# Altium footprint library General.PcbLib: 128 footprints (part 8 of 8)
Each footprint in its own frame and in the unit in brackets; x right, y up, seen from the top. Pads: shape width x height; smd on the part's side, far side on the other; paste and mask are expansions set on the pad; w line width, h text height; cw(c..) or ccw(c..) is an arc to the next point about the centre after c.
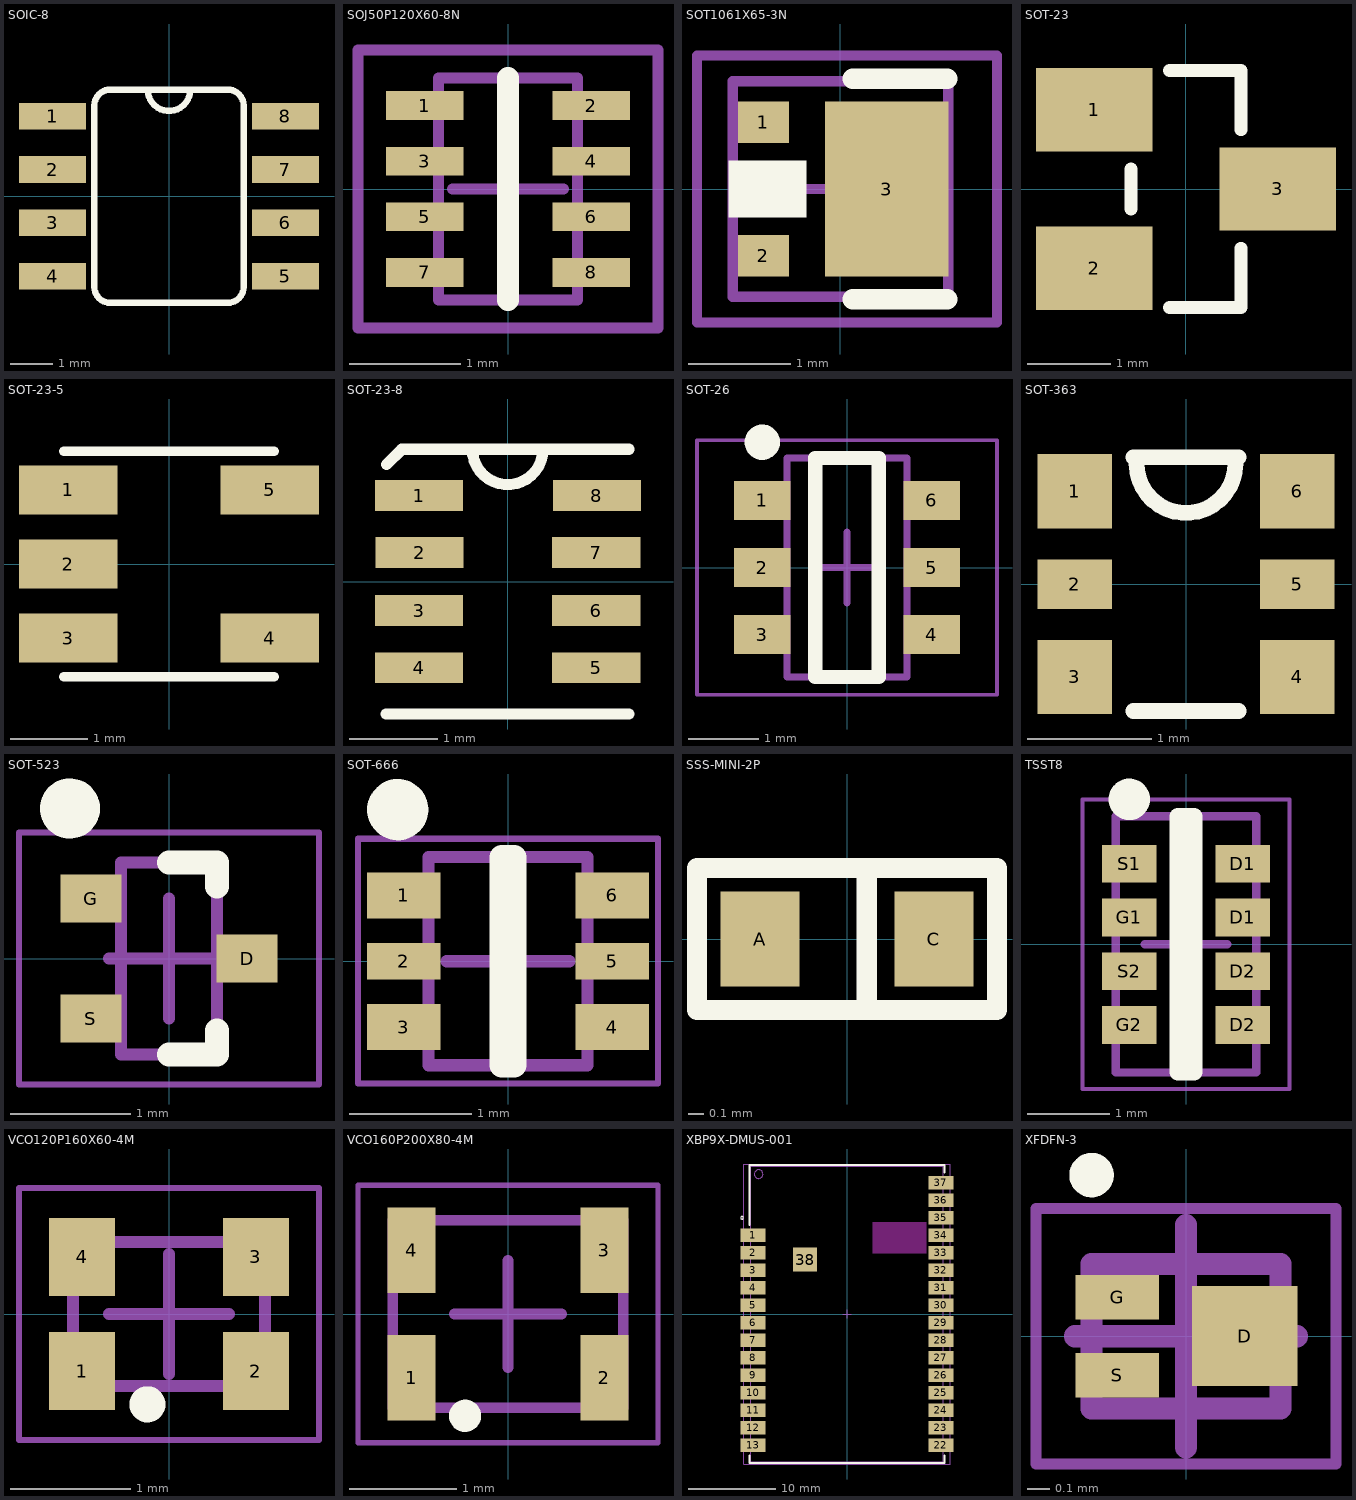
[diagram p7: the footprints below, top view; thin cyan lines are the x and y axes]

## SOIC-8 [mm]
pads (8):
  rect 1.6x0.635 smd: 1(-2.773,1.905) 2(-2.773,0.635) 3(-2.773,-0.635) 4(-2.773,-1.905) 5(2.773,-1.905) 6(2.773,-0.635) 7(2.773,0.635) 8(2.773,1.905)
Top Overlay:
  lines w0.152: -1.422,-2.54 1.422,-2.54 ; -1.422,2.54 1.422,2.54 ; -1.397,-2.54 cw(c-1.397,-2.159) -1.778,-2.159 -1.778,2.159 cw(c-1.397,2.159) -1.397,2.54 ; -0.508,2.54 ccw(c0,2.54) 0.508,2.54 ; 1.397,-2.54 ccw(c1.397,-2.159) 1.778,-2.159 1.778,2.159 ccw(c1.397,2.159) 1.397,2.54
3D body "SW3dPS-Maxim_SOIC8.step": height 1.87, standoff 0.02, extent -3.1,-2.5 3.1,2.5

## SOJ50P120X60-8N [mm] "SOJ, 8-Leads, Body 2.0x1.3mm (max), Pitch 0.50mm, IPC Medium Density"
height 0.6
pads (8):
  rect 0.7x0.26 smd: 1(-0.75,0.75) 2(0.75,0.75) 3(-0.75,0.25) 4(0.75,0.25) 5(-0.75,-0.25) 6(0.75,-0.25) 7(-0.75,-0.75) 8(0.75,-0.75)
Top Overlay:
  lines w0.2: 0,-1 0,1 0,-1
Mechanical 13:
  lines w0.1: -0.625,-1 -0.625,1 0.625,1 0.625,-1 -0.625,-1
Mechanical 15:
  lines w0.1: -0.5,0 0.5,0 ; 0,-0.5 0,0.5 ; -1.35,-1.25 -1.35,1.25 1.35,1.25 1.35,-1.25 -1.35,-1.25
3D body: height 0.6, standoff 0.01, extent -0.625,-1 0.625,1

## SOT1061X65-3N [mm] "SOT1061, 3-Leads, Body 2.1x2.3mm (max), Pitch 0.65mm, IPC Medium Density"
height 0.65
pads (3):
  rect 0.5x0.4 smd: 1(-0.75,0.65) 2(-0.75,-0.65)
  rect 1.2x1.7 smd: 3(0.45,0)
Top Overlay:
  rectangle: -1.092,-0.279 -0.33,0.279
  lines w0.2: 0.121,-1.075 1.041,-1.075 ; 0.121,1.075 1.041,1.075
Mechanical 13:
  lines w0.1: -1.05,-1.05 1.05,-1.05 1.05,1.05 -1.05,1.05 -1.05,-1.05
Mechanical 15:
  lines w0.1: -0.5,0 0.5,0 ; 0,-0.5 0,0.5 ; -1.397,-1.3 1.524,-1.3 1.524,1.3 -1.397,1.3 -1.397,-1.3
3D body: height 0.65, standoff 0, extent -1.05,-1.05 1.05,1.05

## SOT-23 [mm]
pads (3):
  rect 1.4x1 smd: 1(-1.1,0.95) 2(-1.1,-0.95) 3(1.1,0)
Top Overlay:
  lines w0.152: -0.66,-0.24 -0.66,0.24 ; -0.198,-1.422 0.66,-1.422 0.66,-0.711 ; -0.198,1.422 0.66,1.422 0.66,0.711
3D body "SW3dPS-SOT-23.step": height 0.98, standoff -0.02, extent -1.21,-1.448 1.21,1.448

## SOT-23-5 [mm]
pads (5):
  rect 1.27x0.635 smd: 1(-1.295,0.953) 2(-1.295,0) 3(-1.295,-0.953) 4(1.295,-0.953) 5(1.295,0.953)
Top Overlay:
  lines w0.127: -1.35,-1.45 1.35,-1.45 ; -1.35,1.45 1.35,1.45
3D body "SW3dPS-SOT23-5.STEP": height 1.12, standoff 0.02, extent -1.395,-1.447 1.405,1.453

## SOT-23-8 [mm]
pads (8):
  rect 1x0.35 smd: 1(-1.004,0.976) 2(-0.999,0.329) 3(-1.004,-0.329) 4(-1.004,-0.976) 5(1.004,-0.976) 6(1.004,-0.329) 7(1.004,0.329) 8(1.012,0.976)
Top Overlay:
  lines w0.127: -1.375,-1.5 1.375,-1.5 ; -1.372,1.328 -1.2,1.5 -0.4,1.5 ; 1.375,1.5 0.4,1.5 ; -0.4,1.5 ccw(c0,1.5) 0.4,1.5 ; -0.4,1.5 0.4,1.5
3D body "User Library-SOT23-8.step": height 1.11, standoff 0, extent -1.4,-1.5 1.403,1.5

## SOT-26 [mm] "SOT26, 6-Leads, Body 3.00x2.85mm, Pitch 0.95mm, IPC Medium Density"
height 1.4
pads (6):
  rect 0.8x0.55 smd: 1(-1.2,0.95) 2(-1.2,0) 3(-1.2,-0.95) 4(1.2,-0.95) 5(1.2,0) 6(1.2,0.95)
Top Overlay:
  circle w0.25: c-1.2,1.775 r0.125
  lines w0.2: -0.45,-1.55 -0.45,1.55 0.45,1.55 0.45,-1.55 -0.45,-1.55
Mechanical 13:
  lines w0.1: -0.85,-1.55 0.85,-1.55 0.85,1.55 -0.85,1.55 -0.85,-1.55
Mechanical 15:
  lines w0.05: -2.125,-1.8 2.125,-1.8 2.125,1.8 -2.125,1.8 -2.125,-1.8
  lines w0.1: -0.5,0 0.5,0 ; 0,-0.5 0,0.5
3D body "SOT26.step": height 1.4, standoff 0, extent -1.5,-1.55 1.5,1.55

## SOT-363 [mm]
pads (6):
  rect 0.6x0.6 smd: 1(-0.9,0.75) 3(-0.9,-0.75) 4(0.9,-0.75) 6(0.9,0.75)
  rect 0.6x0.4 smd: 2(-0.9,0) 5(0.9,0)
Top Overlay:
  lines w0.127: -0.425,-1.025 0.425,-1.025 ; -0.425,1.025 0.425,1.025 ; -0.4,0.975 ccw(c0,0.975) 0.4,0.975
3D body "User Library-SW3dPS-SOT363.step": height 1.01, standoff 0.02, extent -1.05,-1 1.05,1

## SOT-523 [mm] "SOT523, 3-Leads, Body 1.55x1.60mm, Pitch 0.50mm, IPC Medium Density"
height 0.8
pads (3):
  rect 0.51x0.4 smd: D(0.65,0) G(-0.65,0.5) S(-0.65,-0.5)
Top Overlay:
  circle w0.25: c-0.825,1.25 r0.125
  lines w0.2: 0,-0.8 0.4,-0.8 0.4,-0.6 ; 0,0.8 0.4,0.8 0.4,0.6
Mechanical 13:
  lines w0.1: -0.4,-0.8 0.4,-0.8 0.4,0.8 -0.4,0.8 -0.4,-0.8
Mechanical 15:
  lines w0.05: -1.25,-1.05 1.25,-1.05 1.25,1.05 -1.25,1.05 -1.25,-1.05
  lines w0.1: -0.5,0 0.5,0 ; 0,-0.5 0,0.5
3D body "SOT50P160X80-3N.step": height 0.8, standoff 0, extent -0.875,-0.8 0.875,0.8

## SOT-666 [mm] "SOTFL, 6-Leads, Body 1.60x1.60mm, Pitch 0.50mm, IPC Medium Density"
height 0.6
pads (6):
  rect 0.6x0.375 smd: 1(-0.85,0.537) 3(-0.85,-0.537) 4(0.85,-0.537) 6(0.85,0.537)
  rect 0.6x0.3 smd: 2(-0.85,0) 5(0.85,0)
Top Overlay:
  circle w0.25: c-0.9,1.237 r0.125
  lines w0.2: -0.05,-0.85 0.05,-0.85 0.05,0.85 -0.05,0.85 -0.05,-0.85
Mechanical 13:
  lines w0.1: -0.65,-0.85 -0.65,0.85 0.65,0.85 0.65,-0.85 -0.65,-0.85
Mechanical 15:
  lines w0.05: -1.225,-1 -1.225,1 1.225,1 1.225,-1 -1.225,-1
  lines w0.1: -0.5,0 0.5,0 ; 0,-0.5 0,0.5
3D body "User Library-SOT50P160X60-6.STEP": height 0.6, standoff 0, extent -0.8,-0.796 0.8,0.795

## SSS-MINI-2P [mm]
pads (2):
  rect 0.5x0.6 smd: A(-0.55,0) C(0.55,0)
Top Overlay:
  lines w0.127: 0.125,-0.4 0.125,0.4 ; -0.95,-0.45 0.95,-0.45 0.95,0.45 -0.95,0.45 -0.95,-0.45
3D body: height 0.56, standoff 0, extent 0.301,-0.299 0.499,0.299
3D body: height 0.55, standoff 0, extent -0.5,-0.3 0.5,0.3

## TSST8 [mm] "TSST, 8-Leads, Body 3.03x1.63mm, Pitch 0.65mm, IPC Medium Density"
height 1.1
pads (8):
  rect 0.66x0.457 smd: D1(0.686,0.325) D1(0.686,0.975) D2(0.686,-0.975) D2(0.686,-0.325) G1(-0.686,0.325) G2(-0.686,-0.975) S1(-0.686,0.975) S2(-0.686,-0.325)
Top Overlay:
  circle w0.25: c-0.686,1.753 r0.125
  lines w0.2: -0.1,-1.55 0.1,-1.55 0.1,1.55 -0.1,1.55 -0.1,-1.55
Mechanical 13:
  lines w0.1: -0.85,-1.55 0.85,-1.55 0.85,1.55 -0.85,1.55 -0.85,-1.55
Mechanical 15:
  lines w0.05: -1.25,-1.75 1.25,-1.75 1.25,1.75 -1.25,1.75 -1.25,-1.75
  lines w0.1: -0.5,0 0.5,0 ; 0,-0.5 0,0.5
3D body: height 1.1, standoff 0, extent -0.85,-1.55 0.85,1.55

## VCO120P160X60-4M [mm] "VCO, 4-Leads, Body 1.20x1.60mm, Pitch 1.20mm"
height 0.6
pads (4):
  rect 0.55x0.65 smd: 1(-0.725,-0.475) 2(0.725,-0.475) 3(0.725,0.475) 4(-0.725,0.475)
Top Overlay:
  circle w0.2: c-0.18,-0.753 r0.05
Mechanical 13:
  lines w0.1: -0.8,-0.6 0.8,-0.6 0.8,0.6 -0.8,0.6 -0.8,-0.6
Mechanical 15:
  lines w0.05: -1.25,-1.05 1.25,-1.05 1.25,1.05 -1.25,1.05 -1.25,-1.05
  lines w0.1: -0.5,0 0.5,0 ; 0,-0.5 0,0.5
3D body: height 0.6, standoff 0, extent -0.799,-0.599 0.799,0.599

## VCO160P200X80-4M [mm] "VCO, 4-Leads, Body 1.60x2.00mm, Pitch 1.60mm"
height 0.8
pads (4):
  rect 0.45x0.8 smd: 1(-0.9,-0.595) 2(0.9,-0.595) 3(0.9,0.595) 4(-0.9,0.595)
Top Overlay:
  circle w0.2: c-0.4,-0.95 r0.05
Mechanical 13:
  lines w0.1: -1.075,-0.875 1.075,-0.875 1.075,0.875 -1.075,0.875 -1.075,-0.875
Mechanical 15:
  lines w0.05: -1.4,-1.2 1.4,-1.2 1.4,1.2 -1.4,1.2 -1.4,-1.2
  lines w0.1: -0.5,0 0.5,0 ; 0,-0.5 0,0.5
3D body "VCO160P200X80-4M.step": height 0.8, standoff 0, extent -1.075,-0.875 1.075,0.875

## XBP9X-DMUS-001 [mm] "XBEE PRO MOD TXRX ISM 915MHZ UFL"
height 3.56
pads (30):
  rect 2.84x1.52 smd: 1(-10.744,9) 2(-10.744,7) 3(-10.744,5) 4(-10.744,3) 5(-10.744,1) 6(-10.744,-1) 7(-10.744,-3) 8(-10.744,-5) 9(-10.744,-7) 10(-10.744,-9) 11(-10.744,-11) 12(-10.744,-13) 13(-10.744,-15) 22(10.744,-15) 23(10.744,-13) 24(10.744,-11) 25(10.744,-9) 26(10.744,-7) 27(10.744,-5) 28(10.744,-3) 29(10.744,-1) 30(10.744,1) 31(10.744,3) 32(10.744,5) 33(10.744,7) 34(10.744,9) 35(10.744,11) 36(10.744,13) 37(10.744,15)
  rect 2.79x2.79 smd: 38(-4.8,6.23)
Top Layer keep-out:
  rectangle: 2.9,6.9 9.1,10.5
Top Overlay:
  circle w0.1: c-12,11 r0.15
  lines w0.2: -11.15,-16.16 -11.15,-17.04 11.15,-17.04 11.15,-16.16 ; -11.15,10.16 -11.15,17.04 11.15,17.04 11.15,16.16
Mechanical 13:
  circle w0.1: c-10.1,15.99 r0.5
  region: -8.5,-14.9
  lines w0.1: -11,-16.89 -11,16.89 11,16.89 11,-16.89 -11,-16.89
Mechanical 15:
  lines w0.05: -11.805,-17.15 -11.805,17.15 11.805,17.15 11.805,-17.15 -11.805,-17.15
  lines w0.1: -0.5,0 0.5,0 ; 0,-0.5 0,0.5
3D body "U.FL-R-SMT-1.stp": height 2.25, standoff 1, extent 4.7,11.05 7.7,14.15
3D body: height 1, standoff 0, extent -10.999,-16.889 10.999,16.889
3D body: height 2.5, standoff 1, extent -9.6,-15.5 9.5,9
3D body: height 23.5, standoff 22.25, extent 13.9,-18.3 13.9,-18.3

## XFDFN-3 [mm] "DFN, 3-Leads, Body 0.60x0.80mm, Pitch 0.65mm, IPC Medium Density"
height 0.4
pads (3):
  rect 0.475x0.45 smd: D(0.265,0)
  rect 0.375x0.2 smd: G(-0.31,0.175) S(-0.31,-0.175)
Top Overlay:
  circle w0.1: c-0.425,0.725 r0.05
Mechanical 13:
  lines w0.1: -0.425,-0.325 0.425,-0.325 0.425,0.325 -0.425,0.325 -0.425,-0.325
Mechanical 15:
  lines w0.05: -0.675,-0.575 0.675,-0.575 0.675,0.575 -0.675,0.575 -0.675,-0.575
  lines w0.1: -0.5,0 0.5,0 ; 0,-0.5 0,0.5
3D body: height 0.4, standoff 0, extent -0.425,-0.325 0.425,0.325